# Altium footprint library Electrocardiogram&Heart Rate-libpcb.PcbLib: 13 footprints
Each footprint in its own frame and in the unit in brackets; x right, y up, seen from the top. Pads: shape width x height; smd on the part's side, far side on the other; paste and mask are expansions set on the pad; w line width, h text height; cw(c..) or ccw(c..) is an arc to the next point about the centre after c.
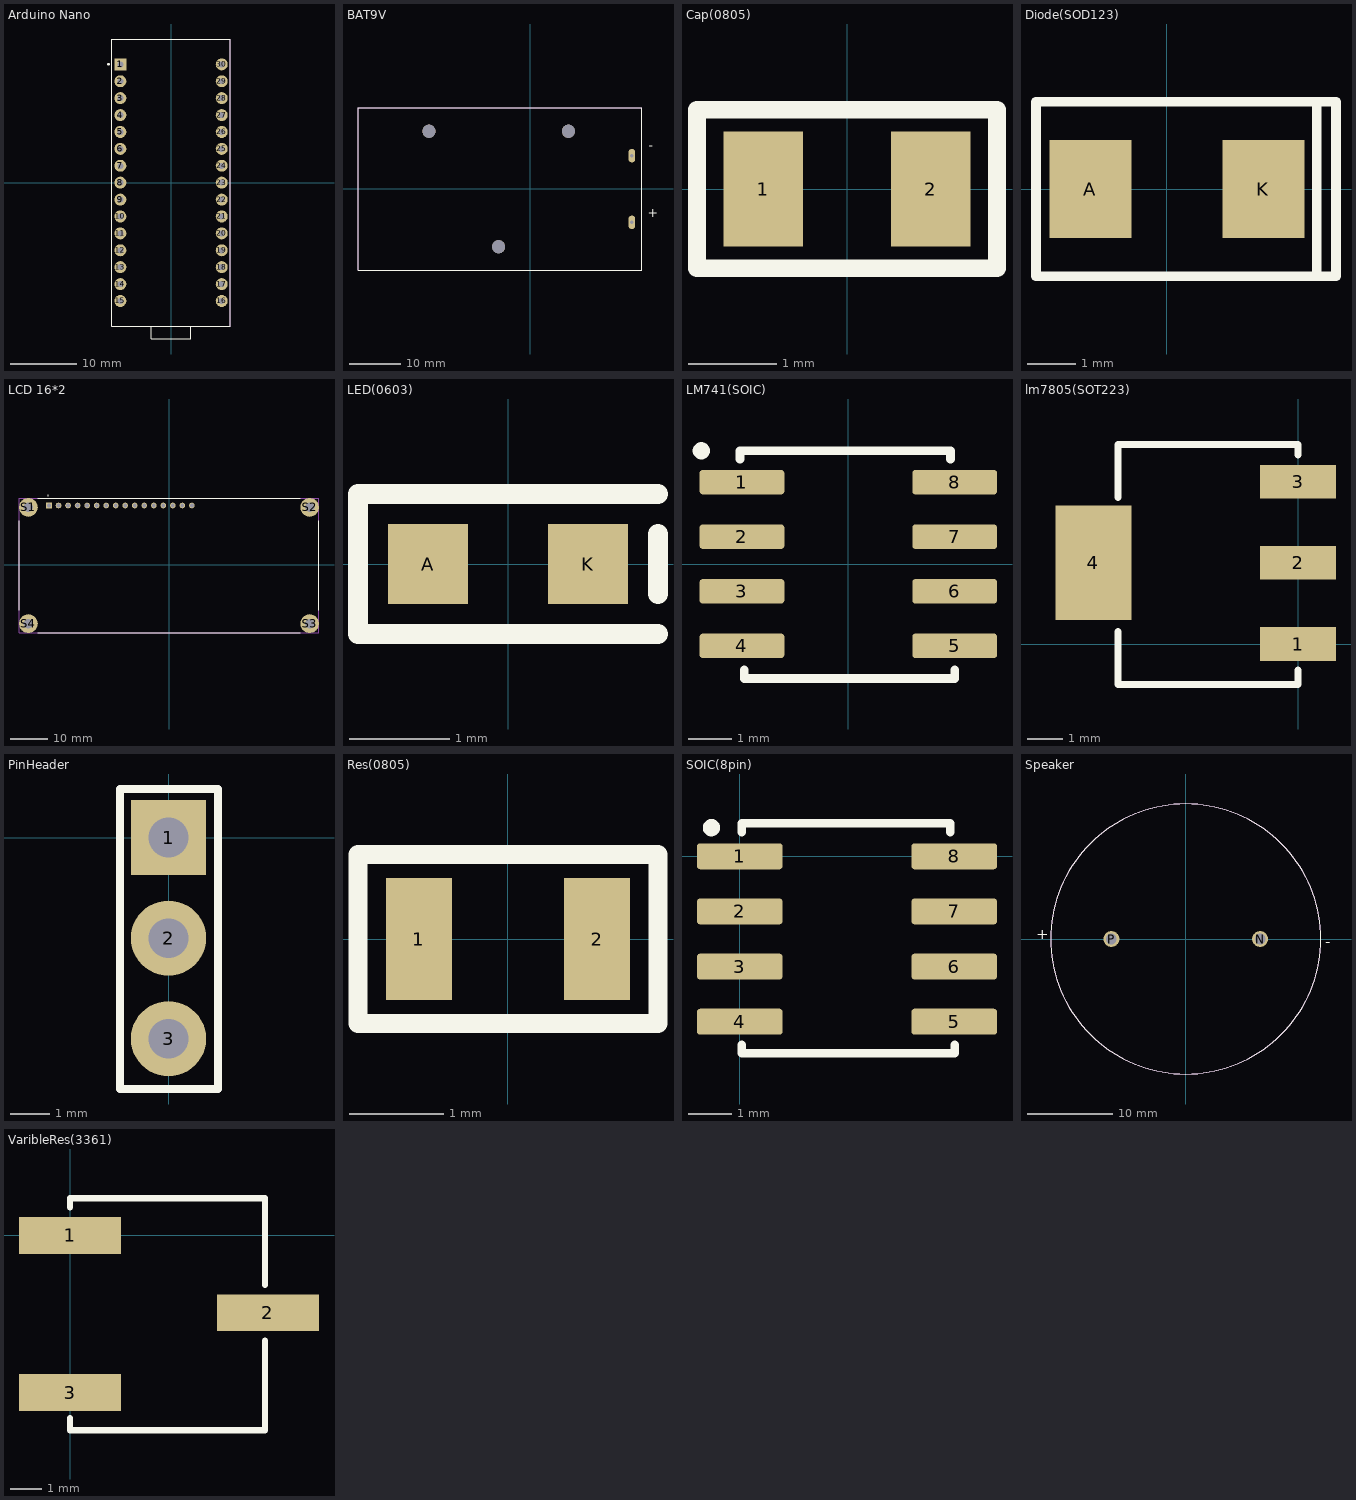
[diagram p0: the footprints below, top view; thin cyan lines are the x and y axes]

## Arduino Nano [mm]
pads (30):
  rect 1.8x1.8 hole 0.9: 1(-7.62,17.78)
  round 1.8 hole 0.9: 2(-7.62,15.24) 3(-7.62,12.7) 4(-7.62,10.16) 5(-7.62,7.62) 6(-7.62,5.08) 7(-7.62,2.54) 8(-7.62,0) 9(-7.62,-2.54) 10(-7.62,-5.08) 11(-7.62,-7.62) 12(-7.62,-10.16) 13(-7.62,-12.7) 14(-7.62,-15.24) 15(-7.62,-17.78) 16(7.62,-17.78) 17(7.62,-15.24) 18(7.62,-12.7) 19(7.62,-10.16) 20(7.62,-7.62) 21(7.62,-5.08) 22(7.62,-2.54) 23(7.62,0) 24(7.62,2.54) 25(7.62,5.08) 26(7.62,7.62) 27(7.62,10.16) 28(7.62,12.7) 29(7.62,15.24) 30(7.62,17.78)
Top Overlay:
  circle w0.2: c-9.4,17.8 r0.1
  lines w0.127: -2.97,-21.59 -2.97,-23.495 3,-23.495 3,-21.59 ; -8.89,-21.59 8.89,-21.59 8.89,21.59 -8.89,21.59 -8.89,-21.59
Mechanical 13:
  lines w0.127: -8.89,-21.59 -2.97,-21.59 3,-21.59 8.89,-21.59 8.89,21.59 -8.89,21.59 -8.89,-21.59
3D body "User Library-Nano-1.STEP": height 8.58, standoff -9.98, extent -8.895,-20.8 8.895,24.12

## BAT9V [mm]
pads (5):
  oval 1.3x2.6 hole 0.66 square: NEG(19.63,6.435) POS(19.63,-6.445)
  round 2.54 hole 2.54 unplated: ""(-19.63,11.175) ""(-6.15,-11.175) ""(7.34,11.175)
Top Overlay:
  lines w0.127: -33.36,-15.69 -33.36,15.68 21.58,15.68 21.58,-15.69 -33.36,-15.69
  text "-" at 22.91,7.595 h1.78
  text "+" at 22.71,-5.505 h1.78
Mechanical 13:
  lines w0.127: -33.36,-15.69 -33.36,15.68 21.58,15.68 21.58,-15.69 -33.36,-15.69
3D body "BA9VPC--3DModel-STEP-56544.STEP": height 21.42, standoff -5.45, extent -33.233,-15.689 21.707,15.68

## Cap(0805) [mm]
pads (2):
  rect 0.9x1.3 smd: 1(-0.95,0) 2(0.95,0)
Top Overlay:
  lines w0.2: -1.7,-0.9 -1.7,0.9 1.7,0.9 1.7,-0.9 -1.7,-0.9
3D body "User Library-User Library-0805(2012M) Cap.step": height 1.3, standoff 0.01, extent -1,-0.645 1,0.645

## Diode(SOD123) [mm]
pads (2):
  rect 1.7x2.03 smd: A(-1.575,0) K(2,0)
Top Overlay:
  lines w0.2: 3.1,-1.8 3.5,-1.8 3.5,1.8 3.1,1.8 ; 3.1,-1.8 -2.7,-1.8 -2.7,1.8 3.1,1.8 ; 3.1,-1.8 3.1,1.8
3D body "User Library-Diode SMD 1N4007-1.STEP": height 2.44, standoff 0.01, extent -2.45,-1.555 2.85,1.555

## LCD 16*2 [mm]
pads (20):
  rect 1.508x1.508 hole 1: 1(-32,15.75)
  round 1.508 hole 1: 2(-29.46,15.75) 3(-26.92,15.75) 4(-24.38,15.75) 5(-21.84,15.75) 6(-19.3,15.75) 7(-16.76,15.75) 8(-14.22,15.75) 9(-11.68,15.75) 10(-9.14,15.75) 11(-6.6,15.75) 12(-4.06,15.75) 13(-1.52,15.75) 14(1.02,15.75) 15(3.56,15.75) 16(6.1,15.75)
  round 5 hole 2.5: S1(-37.5,15.25) S2(37.5,15.25) S3(37.5,-15.75) S4(-37.5,-15.75)
Top Overlay:
  circle w0.2: c-32.3,18.45 r0.1
  lines w0.127: -40,-12.25 -40,11.75 ; -35,-18.25 35,-18.25 ; -35,17.75 35,17.75 ; 40,-12.25 40,11.75
Mechanical 13:
  lines w0.127: -40,-18.25 -40,17.75 40,17.75 40,-18.25 -40,-18.25
3D body "LCD_Custom.step": height 9.81, standoff -8.49, extent -40,-18.2 40,17.8

## LED(0603) [mm]
pads (2):
  rect 0.8x0.8 smd: A(-0.8,0) K(0.8,0)
Top Overlay:
  lines w0.2: 1.5,-0.7 -1.5,-0.7 -1.5,0.7 1.5,0.7 ; 1.5,-0.3 1.5,0.3
3D body "User Library-LED SMD0603.step": height 0.69, standoff 0.01, extent -0.808,-0.368 0.843,0.357

## LM741(SOIC) [mm]
pads (8):
  rrect25% 1.97x0.57 smd: 1(-2.475,1.905) 2(-2.475,0.635) 3(-2.475,-0.635) 4(-2.475,-1.905) 5(2.475,-1.905) 6(2.475,-0.635) 7(2.475,0.635) 8(2.475,1.905)
Top Overlay:
  circle w0.2: c-3.421,2.635 r0.1
  lines w0.2: -2.521,2.435 -2.521,2.635 2.379,2.635 2.379,2.435 ; -2.421,-2.465 -2.421,-2.665 2.479,-2.665 2.479,-2.465
3D body "LM741CM.STEP": height 1.74, standoff -0.01, extent -3.218,-2.416 2.776,2.486

## lm7805(SOT223) [mm]
pads (4):
  rect 2.15x0.95 smd: 1(0,0) 2(0,2.3) 3(0,4.6)
  rect 2.15x3.25 smd: 4(-5.8,2.3)
Top Overlay:
  lines w0.2: -5.1,0.359 -5.1,-1.141 -0.001,-1.141 -0.001,-0.741 ; -5.1,4.159 -5.1,5.659 -0.001,5.659 -0.001,5.359
3D body "lm7805mpx_nopb.stp": height 1.66, standoff 0, extent -6.3,-1 0.7,5.5

## PinHeader [mm]
pads (3):
  rect 1.9x1.9 hole 1: 1(0,0)
  round 1.9 hole 1: 2(0,-2.54) 3(0,-5.08)
Top Overlay:
  lines w0.2: -1.225,-6.35 -1.225,1.225 1.25,1.225 1.25,-6.35 -1.225,-6.35
3D body "User Library-1x3 TH Pitch 2_54mm.STEP": height 6.31, standoff -6.39, extent -1.27,-6.4 1.27,1.22

## Res(0805) [mm]
pads (2):
  rect 0.7x1.3 smd: 1(-0.95,0) 2(0.95,0)
Top Overlay:
  lines w0.2: -1.6,-0.9 -1.6,0.9 1.6,0.9 1.6,-0.9 -1.6,-0.9
3D body "User Library-CR2012-0805.step": height 0.61, standoff 0.01, extent -1,-0.625 1,0.625

## SOIC(8pin) [mm]
pads (8):
  rrect25% 1.97x0.6 smd: 1(0,0) 2(0,-1.27) 3(0,-2.54) 4(0,-3.81) 5(4.94,-3.81) 6(4.94,-2.54) 7(4.94,-1.27) 8(4.94,0)
Top Overlay:
  circle w0.2: c-0.651,0.66 r0.1
  lines w0.2: 0.049,-4.34 0.049,-4.54 4.949,-4.54 4.949,-4.34 ; 0.049,0.56 0.049,0.76 4.849,0.76 4.849,0.552
3D body "INA128UG4.STEP": height 1.75, standoff 0, extent -0.448,-4.391 5.546,0.511

## Speaker [mm]
pads (2):
  round 1.875 hole 1.25: N(8.75,0) P(-8.75,0)
Top Overlay:
  circle w0.127: c0,0 r15.9
  text "+" at -17.632,0 h1.27
  text "-" at 16.42,-0.889 h1.27
Mechanical 13:
  circle w0.127: c0,0 r15.9
3D body "cvs-3108.stp": height 14.11, standoff -6.49, extent -15.89,-15.946 15.91,16.854

## VaribleRes(3361) [mm]
pads (3):
  rect 3.3x1.19 smd: 1(0,0) 2(6.4,-2.5) 3(0,-5.08)
Top Overlay:
  lines w0.2: 0,-5.9 0,-6.3 6.3,-6.3 6.3,-3.4 ; 0,0.9 0,1.2 6.3,1.2 6.3,-1.6
3D body "Varible Res.step": height 5.19, standoff -0.04, extent -1.346,-5.836 7.188,0.869